# Altium footprint library ConnectorsTDH.PcbLib: 194 footprints (part 11 of 13)
Each footprint in its own frame and in the unit in brackets; x right, y up, seen from the top. Pads: shape width x height; smd on the part's side, far side on the other; paste and mask are expansions set on the pad; w line width, h text height; cw(c..) or ccw(c..) is an arc to the next point about the centre after c.
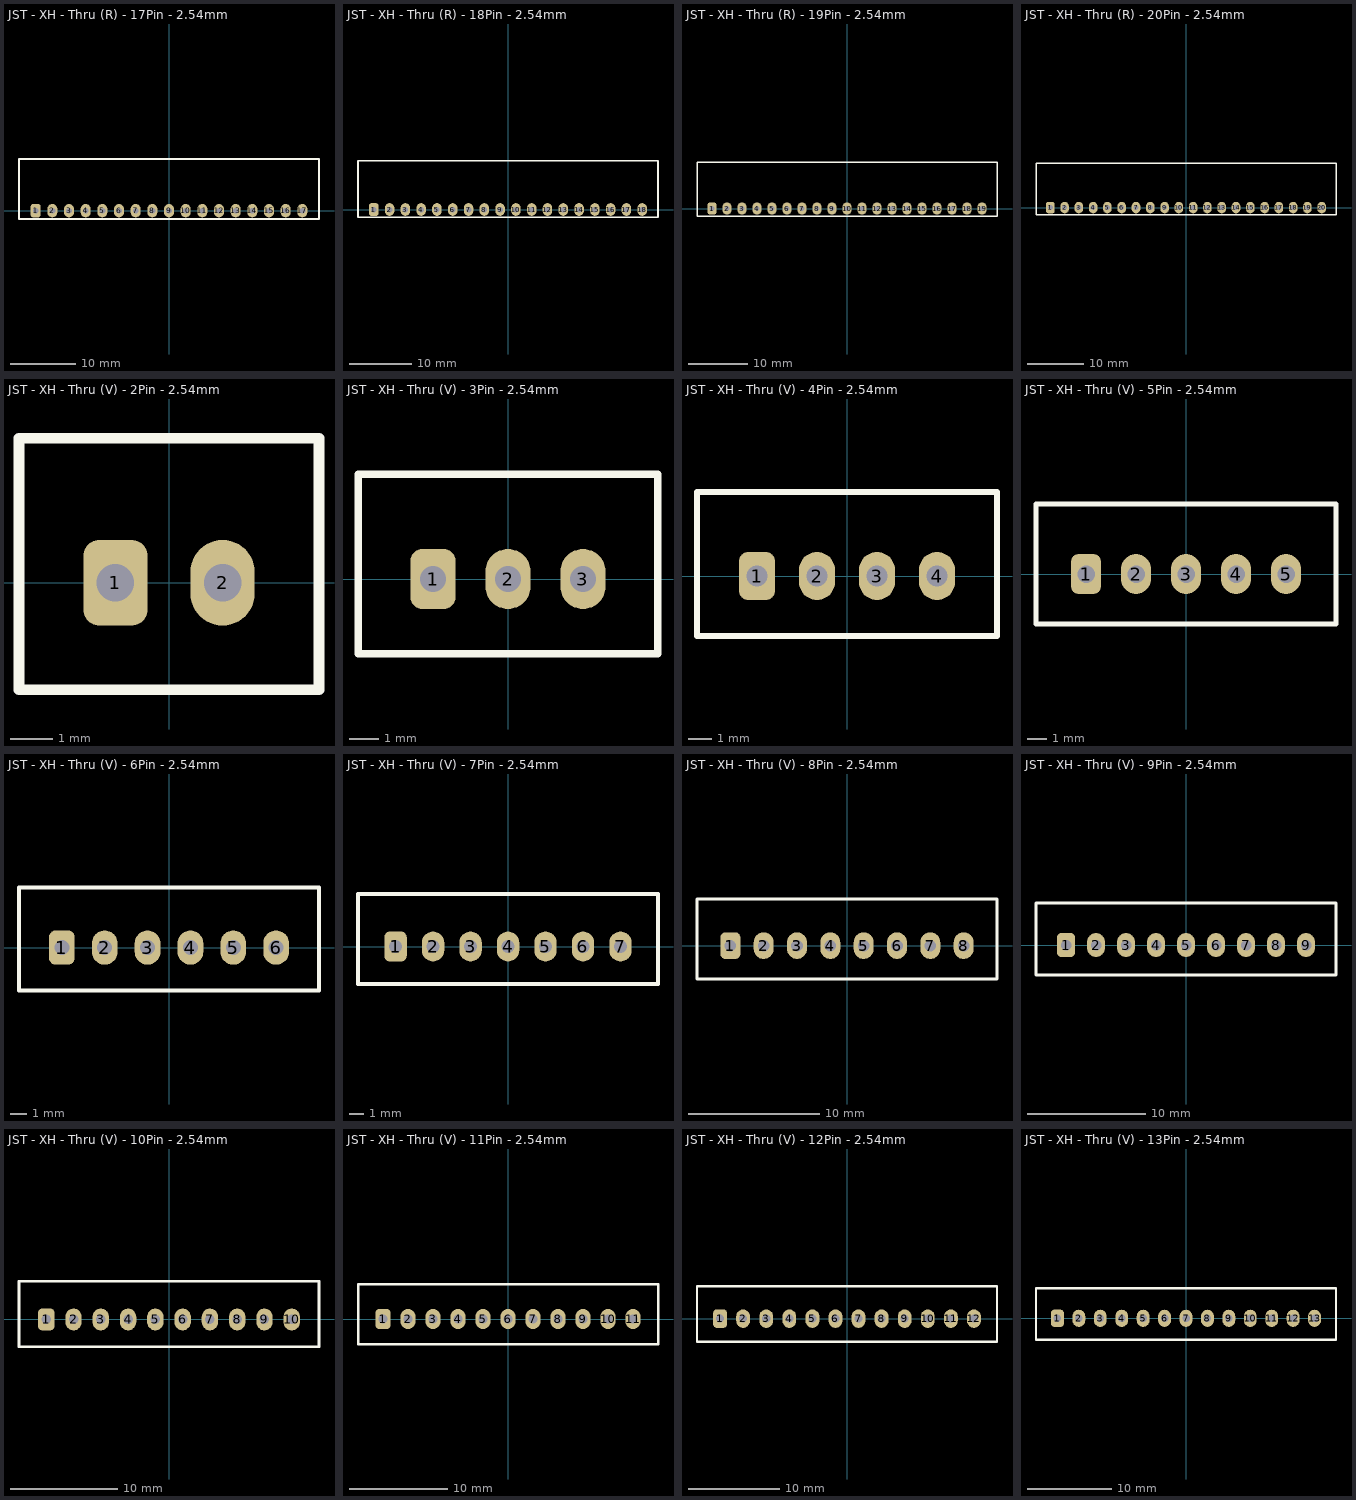
[diagram p10: the footprints below, top view; thin cyan lines are the x and y axes]

## JST - XH - Thru (R) - 17Pin - 2.54mm [mil]
pads (17):
  rrect50% 60x80 hole 35: 1(-800,0)
  oval 60x80 hole 35: 2(-700,0) 3(-600,0) 4(-500,0) 5(-400,0) 6(-300,0) 7(-200,0) 8(-100,0) 9(0,0) 10(100,0) 11(200,0) 12(300,0) 13(400,0) 14(500,0) 15(600,0) 16(700,0) 17(800,0)
Top Overlay:
  lines w10: -900,-50 900,-50 900,310 -900,310 -900,-50
3D body "JST - XH - Thru (R) - 17Pin - 2.54mm.stp": height 230, standoff -133, extent -892,-12.79 892,303.6

## JST - XH - Thru (R) - 18Pin - 2.54mm [mil]
pads (18):
  rrect50% 60x80 hole 35: 1(-850,0)
  oval 60x80 hole 35: 2(-750,0) 3(-650,0) 4(-550,0) 5(-450,0) 6(-350,0) 7(-250,0) 8(-150,0) 9(-50,0) 10(50,0) 11(150,0) 12(250,0) 13(350,0) 14(450,0) 15(550,0) 16(650,0) 17(750,0) 18(850,0)
Top Overlay:
  lines w10: -950,-50 950,-50 950,310 -950,310 -950,-50
3D body "JST - XH - Thru (R) - 18Pin - 2.54mm.stp": height 230, standoff -133, extent -942,-12.79 942,303.6

## JST - XH - Thru (R) - 19Pin - 2.54mm [mil]
pads (19):
  rrect50% 60x80 hole 35: 1(-900,0)
  oval 60x80 hole 35: 2(-800,0) 3(-700,0) 4(-600,0) 5(-500,0) 6(-400,0) 7(-300,0) 8(-200,0) 9(-100,0) 10(0,0) 11(100,0) 12(200,0) 13(300,0) 14(400,0) 15(500,0) 16(600,0) 17(700,0) 18(800,0) 19(900,0)
Top Overlay:
  lines w10: -1000,-50 1000,-50 1000,310 -1000,310 -1000,-50
3D body "JST - XH - Thru (R) - 19Pin - 2.54mm.stp": height 230, standoff -133, extent -992,-12.79 992,303.6

## JST - XH - Thru (R) - 20Pin - 2.54mm [mil]
pads (20):
  rrect50% 60x80 hole 35: 1(-950,0)
  oval 60x80 hole 35: 2(-850,0) 3(-750,0) 4(-650,0) 5(-550,0) 6(-450,0) 7(-350,0) 8(-250,0) 9(-150,0) 10(-50,0) 11(50,0) 12(150,0) 13(250,0) 14(350,0) 15(450,0) 16(550,0) 17(650,0) 18(750,0) 19(850,0) 20(950,0)
Top Overlay:
  lines w10: -1050,-50 -1050,310 1050,310 1050,-50 -1050,-50
3D body "JST - XH - Thru (R) - 20Pin - 2.54mm.stp": height 230, standoff -133, extent -1042,-12.79 1042,303.6

## JST - XH - Thru (V) - 2Pin - 2.54mm [mil]
pads (2):
  rrect50% 60x80 hole 35: 1(-50,0)
  oval 60x80 hole 35: 2(50,0)
Top Overlay:
  lines w10: -140,-100 140,-100 140,135 -140,135 -140,-100
3D body "JST - XH - Thru (V) - 2Pin - 2.54mm.stp": height 284, standoff -118, extent -142,-98 142,132

## JST - XH - Thru (V) - 3Pin - 2.54mm [mil]
pads (3):
  rrect50% 60x80 hole 35: 1(-100,0)
  oval 60x80 hole 35: 2(0,0) 3(100,0)
Top Overlay:
  lines w10: -200,-100 -200,140 200,140 200,-100 -200,-100
3D body "JST - XH - Thru (V) - 3Pin - 2.54mm.stp": height 284, standoff -118, extent -191.99,-98 192.01,132

## JST - XH - Thru (V) - 4Pin - 2.54mm [mil]
pads (4):
  rrect50% 60x80 hole 35: 1(-150,0)
  oval 60x80 hole 35: 2(-50,0) 3(50,0) 4(150,0)
Top Overlay:
  lines w10: -250,-100 250,-100 250,140 -250,140 -250,-100
3D body "JST - XH - Thru (V) - 4Pin - 2.54mm.stp": height 284, standoff -118, extent -241.99,-97.99 242.01,132.01

## JST - XH - Thru (V) - 5Pin - 2.54mm [mil]
pads (5):
  rrect50% 60x80 hole 35: 1(-200,0)
  oval 60x80 hole 35: 2(-100,0) 3(0,0) 4(100,0) 5(200,0)
Top Overlay:
  lines w10: -300,-100 300,-100 300,140 -300,140 -300,-100
3D body "JST - XH - Thru (V) - 5Pin - 2.54mm.stp": height 284, standoff -118, extent -291.99,-97.99 292.01,132.01

## JST - XH - Thru (V) - 6Pin - 2.54mm [mil]
pads (6):
  rrect50% 60x80 hole 35: 1(-250,0)
  oval 60x80 hole 35: 2(-150,0) 3(-50,0) 4(50,0) 5(150,0) 6(250,0)
Top Overlay:
  lines w10: -350,-100 -350,140 350,140 350,-100 -350,-100
3D body "JST - XH - Thru (V) - 6Pin - 2.54mm.stp": height 284, standoff -118, extent -341.99,-97.99 342.01,132.01

## JST - XH - Thru (V) - 7Pin - 2.54mm [mil]
pads (7):
  rrect50% 60x80 hole 35: 1(-300,0)
  oval 60x80 hole 35: 2(-200,0) 3(-100,0) 4(0,0) 5(100,0) 6(200,0) 7(300,0)
Top Overlay:
  lines w10: -400,-100 -400,140 400,140 400,-100 -400,-100
3D body "JST - XH - Thru (V) - 7Pin - 2.54mm.stp": height 284, standoff -118, extent -391.99,-97.99 392.01,132.01

## JST - XH - Thru (V) - 8Pin - 2.54mm [mil]
pads (8):
  rrect50% 60x80 hole 35: 1(-350,0)
  oval 60x80 hole 35: 2(-250,0) 3(-150,0) 4(-50,0) 5(50,0) 6(150,0) 7(250,0) 8(350,0)
Top Overlay:
  lines w10: -450,-100 450,-100 450,140 -450,140 -450,-100
3D body "JST - XH - Thru (V) - 8Pin - 2.54mm.stp": height 284, standoff -118, extent -441.99,-97.99 442.01,132.01

## JST - XH - Thru (V) - 9Pin - 2.54mm [mil]
pads (9):
  rrect50% 60x80 hole 35: 1(-400,0)
  oval 60x80 hole 35: 2(-300,0) 3(-200,0) 4(-100,0) 5(0,0) 6(100,0) 7(200,0) 8(300,0) 9(400,0)
Top Overlay:
  lines w10: -500,-100 -500,140 500,140 500,-100 -500,-100
3D body "JST - XH - Thru (V) - 9Pin - 2.54mm.stp": height 284, standoff -118, extent -491.99,-97.99 492.01,132.01

## JST - XH - Thru (V) - 10Pin - 2.54mm [mil]
pads (10):
  rrect50% 60x80 hole 35: 1(-450,0)
  oval 60x80 hole 35: 2(-350,0) 3(-250,0) 4(-150,0) 5(-50,0) 6(50,0) 7(150,0) 8(250,0) 9(350,0) 10(450,0)
Top Overlay:
  lines w10: -550,-100 -550,140 550,140 550,-100 -550,-100
3D body "JST - XH - Thru (V) - 10Pin - 2.54mm.stp": height 284, standoff -118, extent -541.99,-97.99 542.01,132.01

## JST - XH - Thru (V) - 11Pin - 2.54mm [mil]
pads (11):
  rrect50% 60x80 hole 35: 1(-500,0)
  oval 60x80 hole 35: 2(-400,0) 3(-300,0) 4(-200,0) 5(-100,0) 6(0,0) 7(100,0) 8(200,0) 9(300,0) 10(400,0) 11(500,0)
Top Overlay:
  lines w10: -600,-100 -600,130 -600,140 600,140 600,-100 -600,-100
3D body "JST - XH - Thru (V) - 11Pin - 2.54mm.stp": height 284, standoff -118, extent -591.99,-97.99 592.01,132.01

## JST - XH - Thru (V) - 12Pin - 2.54mm [mil]
pads (12):
  rrect50% 60x80 hole 35: 1(-550,0)
  oval 60x80 hole 35: 2(-450,0) 3(-350,0) 4(-250,0) 5(-150,0) 6(-50,0) 7(50,0) 8(150,0) 9(250,0) 10(350,0) 11(450,0) 12(550,0)
Top Overlay:
  lines w10: -650,-100 -650,140 650,140 650,-100 -650,-100
3D body "JST - XH - Thru (V) - 12Pin - 2.54mm.stp": height 284, standoff -118, extent -641.99,-97.99 642.01,132.01

## JST - XH - Thru (V) - 13Pin - 2.54mm [mil]
pads (13):
  rrect50% 60x80 hole 35: 1(-600,0)
  oval 60x80 hole 35: 2(-500,0) 3(-400,0) 4(-300,0) 5(-200,0) 6(-100,0) 7(0,0) 8(100,0) 9(200,0) 10(300,0) 11(400,0) 12(500,0) 13(600,0)
Top Overlay:
  lines w10: -700,-100 700,-100 700,140 -700,140 -700,-100
3D body "JST - XH - Thru (V) - 13Pin - 2.54mm.stp": height 284, standoff -118, extent -691.99,-97.99 692.01,132.01